# Altium footprint library Lib.PcbLib: 177 footprints (part 9 of 12)
Each footprint in its own frame and in the unit in brackets; x right, y up, seen from the top. Pads: shape width x height; smd on the part's side, far side on the other; paste and mask are expansions set on the pad; w line width, h text height; cw(c..) or ccw(c..) is an arc to the next point about the centre after c.
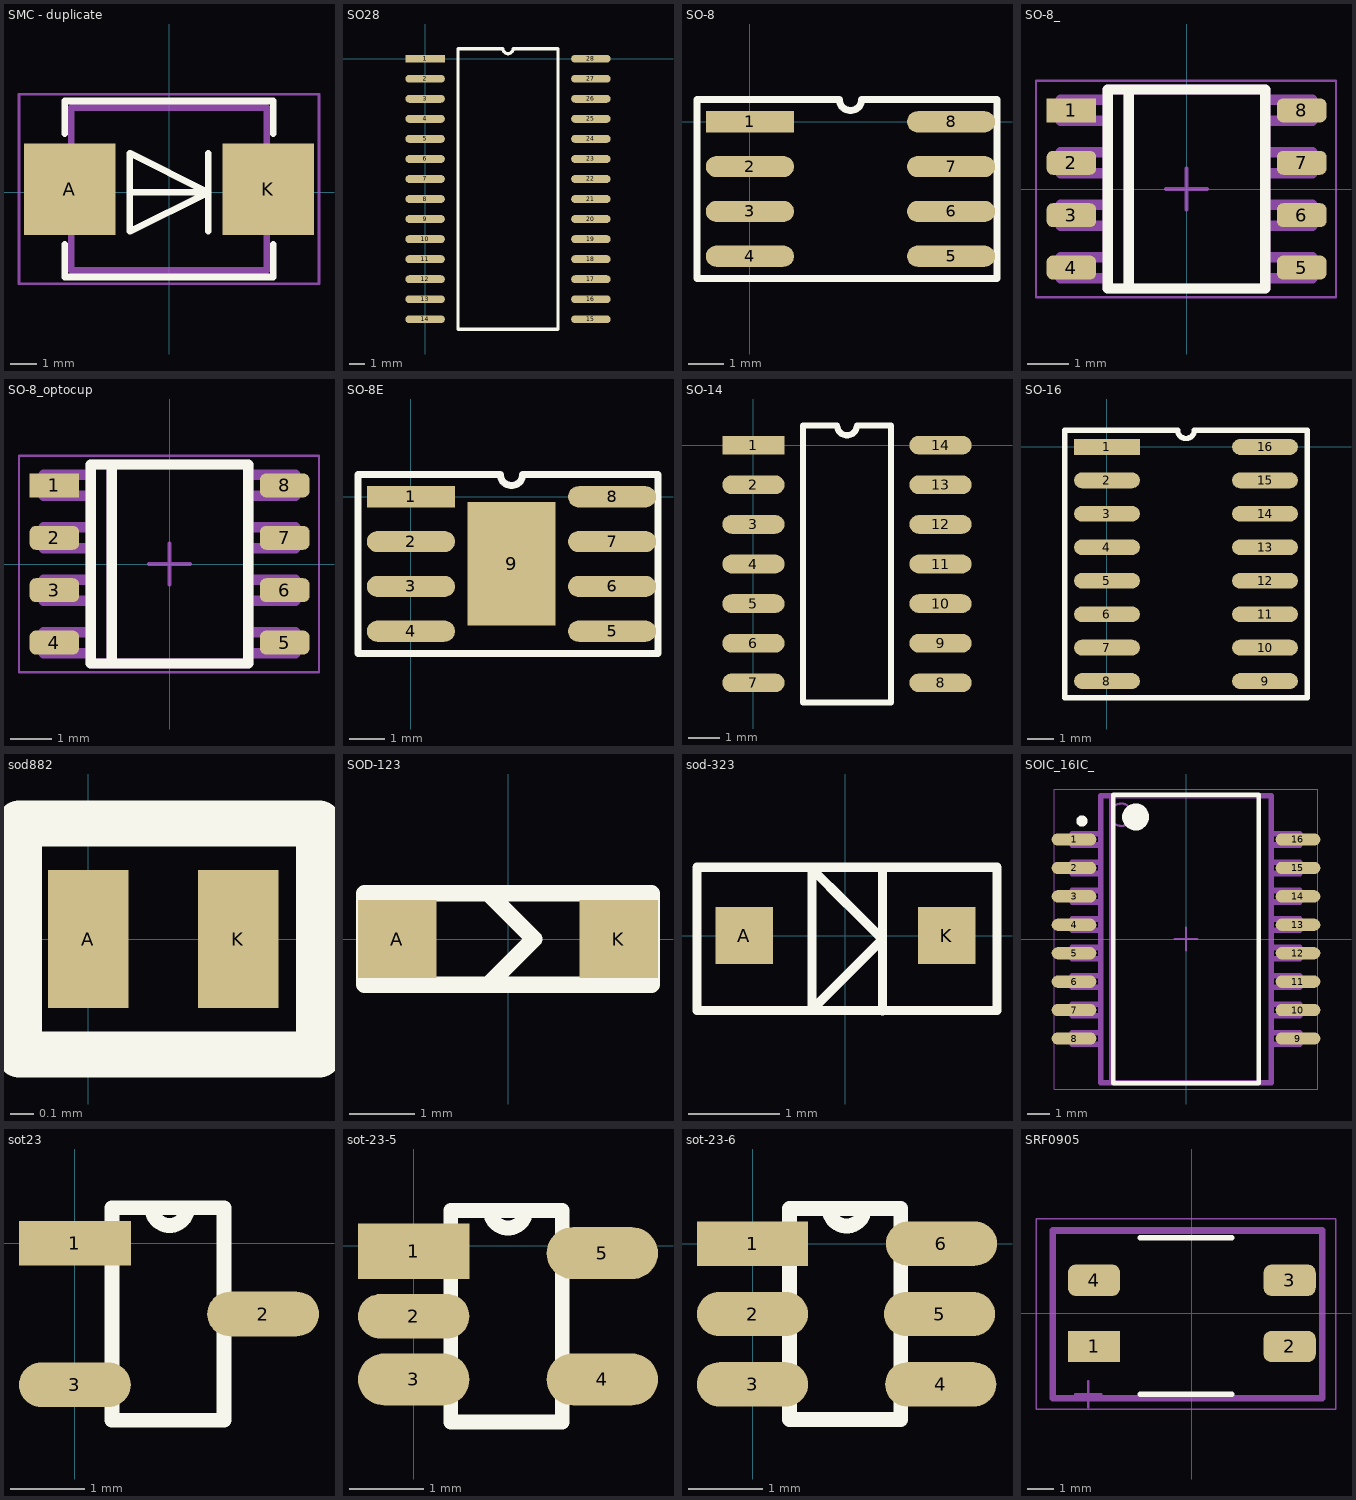
[diagram p8: the footprints below, top view; thin cyan lines are the x and y axes]

## SMC - duplicate [mm]
pads (2):
  rect 3.5x3.5 smd: A(-3.809,0.11) K(3.809,0.11)
Top Overlay:
  lines w0.254: -4,-2 -4,-3.25 4,-3.25 4,-2 ; -4,2.25 -4,3.5 4,3.5 4,2.25 ; -1.5,0 1.5,0 ; 1.5,-1.5 1.5,1.5 ; 1.5,0 -1.5,1.5 -1.5,-1.5 1.5,0
Mechanical 11:
  lines w0.254: -3.75,-3 3.75,-3 3.75,3.25 -3.75,3.25 -3.75,-3
Mechanical 13:
  lines w0.1: -3.809,-3 3.809,-3 3.809,3.22 -3.809,3.22 -3.809,-3
Mechanical 15:
  lines w0.1: -5.75,-3.5 5.75,-3.5 5.75,3.75 -5.75,3.75 -5.75,-3.5
3D body "SW3DPS-SMC-DEFAULT.STEP": height 2.8, standoff 0, extent -3.809,-3 3.809,3.22

## SO28 [mm]
height 2
pads (28):
  rect 2.5x0.5 smd: 1(0,0)
  oval 2.5x0.5 smd: 2(0,-1.27) 3(0,-2.54) 4(0,-3.81) 5(0,-5.08) 6(0,-6.35) 7(0,-7.62) 8(0,-8.89) 9(0,-10.16) 10(0,-11.43) 11(0,-12.7) 12(0,-13.97) 13(0,-15.24) 14(0,-16.51) 15(10.5,-16.51) 16(10.5,-15.24) 17(10.5,-13.97) 18(10.5,-12.7) 19(10.5,-11.43) 20(10.5,-10.16) 21(10.5,-8.89) 22(10.5,-7.62) 23(10.5,-6.35) 24(10.5,-5.08) 25(10.5,-3.81) 26(10.5,-2.54) 27(10.5,-1.27) 28(10.5,0)
Top Overlay:
  lines w0.2: 2.085,-17.145 8.415,-17.145 8.415,0.635 5.567,0.635 cw(c5.25,0.635) 4.932,0.635 2.085,0.635 2.085,-17.145

## SO-8 [mm]
pads (8):
  rect 2.5x0.6 smd: 1(0,0)
  oval 2.5x0.6 smd: 2(0,-1.27) 3(0,-2.54) 4(0,-3.81) 5(5.7,-3.81) 6(5.7,-2.54) 7(5.7,-1.27) 8(5.7,0)
Top Overlay:
  lines w0.2: -1.5,-4.445 7,-4.445 7,0.635 3.167,0.635 cw(c2.85,0.635) 2.532,0.635 -1.5,0.635 -1.5,-4.445
3D body "SW3DPS-SO-8-DEFAULT.STEP": height 1.45, standoff 0, extent 0.011,-4.377 5.789,0.525

## SO-8_ [mm]
height 1.75
pads (8):
  rect 1.2x0.58 smd: 1(-2.794,1.905)
  rrect50% 1.2x0.58 smd: 2(-2.794,0.635) 3(-2.794,-0.635) 4(-2.794,-1.905) 5(2.794,-1.905) 6(2.794,-0.635) 7(2.794,0.635) 8(2.794,1.905)
Top Overlay:
  lines w0.254: -1.397,-2.413 -1.397,2.413 ; -1.905,-2.413 -1.905,2.413 1.905,2.413 1.905,-2.413 -1.905,-2.413
Mechanical 3:
  lines w0.254: -1.905,-2.159 -3.048,-2.159 -3.048,-1.651 -1.905,-1.651 ; -1.905,-0.889 -3.048,-0.889 -3.048,-0.381 -1.905,-0.381 ; -1.905,0.381 -3.048,0.381 -3.048,0.889 -1.905,0.889 ; -1.905,1.651 -3.048,1.651 -3.048,2.159 -1.905,2.159 ; -1.397,-2.413 -1.397,2.413 ; 1.905,-2.159 3.048,-2.159 3.048,-1.651 1.905,-1.651 ; 1.905,-0.889 3.048,-0.889 3.048,-0.381 1.905,-0.381 ; 1.905,0.381 3.048,0.381 3.048,0.889 1.905,0.889 ; 1.905,1.651 3.048,1.651 3.048,2.159 1.905,2.159 ; -1.905,-2.413 1.905,-2.413 1.905,2.413 -1.905,2.413 -1.905,-2.413
Mechanical 13:
  lines w0.1: -1.905,-2.413 -1.905,2.413 1.905,2.413 1.905,-2.413 -1.905,-2.413
Mechanical 15:
  lines w0.05: -3.65,-2.625 3.625,-2.625 3.625,2.625 -3.65,2.625 -3.65,-2.625
  lines w0.1: -0.5,0 0.5,0 ; 0,-0.5 0,0.5
3D body "SW3DPS-SO-8-DEFAULT.STEP": height 1.45, standoff 0, extent -2.889,-2.402 2.889,2.5

## SO-8_optocup [mm]
height 1.75
pads (8):
  rect 1.2x0.58 smd: 1(-2.794,1.905)
  rrect50% 1.2x0.58 smd: 2(-2.794,0.635) 3(-2.794,-0.635) 4(-2.794,-1.905) 5(2.794,-1.905) 6(2.794,-0.635) 7(2.794,0.635) 8(2.794,1.905)
Top Overlay:
  lines w0.254: -1.397,-2.413 -1.397,2.413 ; -1.905,-2.413 1.905,-2.413 1.905,2.413 -1.905,2.413 -1.905,-2.413
Mechanical 3:
  lines w0.254: -1.905,-2.159 -3.048,-2.159 -3.048,-1.651 -1.905,-1.651 ; -1.905,-0.889 -3.048,-0.889 -3.048,-0.381 -1.905,-0.381 ; -1.905,0.381 -3.048,0.381 -3.048,0.889 -1.905,0.889 ; -1.905,1.651 -3.048,1.651 -3.048,2.159 -1.905,2.159 ; -1.397,-2.413 -1.397,2.413 ; 1.905,-2.159 3.048,-2.159 3.048,-1.651 1.905,-1.651 ; 1.905,-0.889 3.048,-0.889 3.048,-0.381 1.905,-0.381 ; 1.905,0.381 3.048,0.381 3.048,0.889 1.905,0.889 ; 1.905,1.651 3.048,1.651 3.048,2.159 1.905,2.159 ; -1.905,-2.413 -1.905,2.413 1.905,2.413 1.905,-2.413 -1.905,-2.413
Mechanical 13:
  lines w0.1: -1.905,-2.413 1.905,-2.413 1.905,2.413 -1.905,2.413 -1.905,-2.413
Mechanical 15:
  lines w0.05: -3.65,-2.625 -3.65,2.625 3.625,2.625 3.625,-2.625 -3.65,-2.625
  lines w0.1: -0.5,0 0.5,0 ; 0,-0.5 0,0.5
3D body "User Library-SOIC127P610X343-8N.STEP": height 3.48, standoff 0, extent -2.99,-2.901 3.01,2.939

## SO-8E [mm]
pads (9):
  rect 2.5x0.6 smd: 1(0,0)
  oval 2.5x0.6 smd: 2(0,-1.27) 3(0,-2.54) 4(0,-3.81) 5(5.7,-3.81) 6(5.7,-2.54) 7(5.7,-1.27) 8(5.7,0)
  rect 2.5x3.5 smd: 9(2.85,-1.9)
Top Overlay:
  lines w0.2: -1.5,-4.445 7,-4.445 7,0.635 3.167,0.635 cw(c2.85,0.635) 2.532,0.635 -1.5,0.635 -1.5,-4.445
3D body "SW3DPS-SO-8-DEFAULT.STEP": height 1.45, standoff 0, extent 0.011,-4.377 5.789,0.525

## SO-14 [mm]
pads (14):
  rect 2x0.6 smd: 1(0,0)
  oval 2x0.6 smd: 2(0,-1.27) 3(0,-2.54) 4(0,-3.81) 5(0,-5.08) 6(0,-6.35) 7(0,-7.62) 8(6,-7.62) 9(6,-6.35) 10(6,-5.08) 11(6,-3.81) 12(6,-2.54) 13(6,-1.27) 14(6,0)
Top Overlay:
  lines w0.2: 1.585,-8.255 4.415,-8.255 4.415,0.635 3.317,0.635 cw(c3,0.635) 2.682,0.635 1.585,0.635 1.585,-8.255

## SO-16 [mm]
pads (16):
  rect 2.5x0.6 smd: 1(0,0)
  oval 2.5x0.6 smd: 2(0,-1.27) 3(0,-2.54) 4(0,-3.81) 5(0,-5.08) 6(0,-6.35) 7(0,-7.62) 8(0,-8.89) 9(6,-8.89) 10(6,-7.62) 11(6,-6.35) 12(6,-5.08) 13(6,-3.81) 14(6,-2.54) 15(6,-1.27) 16(6,0)
Top Overlay:
  lines w0.2: -1.6,-9.525 -1.6,0.635 2.682,0.635 ccw(c3,0.635) 3.317,0.635 7.6,0.635 7.6,-9.525 -1.6,-9.525
3D body: height 2, standoff 0.2, extent 0,-9.5 6,0.5

## sod882 [mm]
pads (2):
  rect 0.35x0.6 smd: A(0,0) K(0.65,0)
Top Overlay:
  lines w0.2: -0.3,-0.5 1,-0.5 1,0.5 -0.3,0.5 -0.3,-0.5
3D body "User Library-SOD882.step": height 0.49, standoff -0.01, extent -0.186,-0.311 0.836,0.311

## SOD-123 [mm]
height 2
pads (2):
  rect 1.2x1.2 smd: A(-1.7,0) K(1.7,0)
Top Overlay:
  lines w0.254: -0.3,-0.7 0.4,0 ; -0.3,0.7 0.4,0 ; -0.3,0.7 -0.3,0.7 ; 0.4,0 0.4,0 ; -2.2,-0.7 2.2,-0.7 2.2,0.7 -2.2,0.7 -2.2,-0.7
3D body "CircuitWorks-SOD123.step": height 1.3, standoff 0.03, extent -1.85,-0.8 1.85,0.8

## sod-323 [mm]
pads (2):
  rect 0.63x0.63 smd: A(-1.115,0) K(1.115,0)
Top Overlay:
  lines w0.1: -0.375,0.741 0.017,0.349 ; -0.375,-0.824 0.408,-0.041 0.017,0.35 ; -0.369,-0.814 -0.369,0.747 ; 0.408,-0.827 0.408,0.741 ; 0.017,0.349 0.017,0.35 ; -1.636,-0.824 -1.636,0.754 1.669,0.754 1.669,-0.824 -1.636,-0.824
3D body "User Library-SOD-323F.STEP": height 0.79, standoff -0.08, extent -1.35,-0.725 1.35,0.625

## SOIC_16IC_ [mm] "D?"
height 2.64
pads (16):
  oval 2x0.55 smd: 1(-5,4.445) 2(-5,3.175) 3(-5,1.905) 4(-5,0.635) 5(-5,-0.635) 6(-5,-1.905) 7(-5,-3.175) 8(-5,-4.445) 9(5,-4.445) 10(5,-3.175) 11(5,-1.905) 12(5,-0.635) 13(5,0.635) 14(5,1.905) 15(5,3.175) 16(5,4.445)
Top Overlay:
  circle w0.6: c-2.25,5.45 r0.3
  circle w0.25: c-4.65,5.27 r0.125
  lines w0.2: -3.25,-6.45 3.25,-6.45 3.25,6.45 -3.25,6.45 -3.25,-6.45
Mechanical 3:
  lines w0.254: -3.81,-4.695 -5.08,-4.695 -5.08,-4.187 -3.81,-4.187 ; -3.81,-3.425 -5.08,-3.425 -5.08,-2.917 -3.81,-2.917 ; -3.81,-2.155 -5.08,-2.155 -5.08,-1.647 -3.81,-1.647 ; -3.81,-0.885 -5.08,-0.885 -5.08,-0.377 -3.81,-0.377 ; -3.81,0.385 -5.08,0.385 -5.08,0.893 -3.81,0.893 ; -3.81,1.655 -5.08,1.655 -5.08,2.163 -3.81,2.163 ; -3.81,2.925 -5.08,2.925 -5.08,3.433 -3.81,3.433 ; -3.81,4.195 -5.08,4.195 -5.08,4.703 -3.81,4.703 ; -3.302,-6.4 -3.302,6.4 ; 3.81,-4.695 5.08,-4.695 5.08,-4.187 3.81,-4.187 ; 3.81,-3.425 5.08,-3.425 5.08,-2.917 3.81,-2.917 ; 3.81,-2.155 5.08,-2.155 5.08,-1.647 3.81,-1.647 ; 3.81,-0.885 5.08,-0.885 5.08,-0.377 3.81,-0.377 ; 3.81,0.385 5.08,0.385 5.08,0.893 3.81,0.893 ; 3.81,1.655 5.08,1.655 5.08,2.163 3.81,2.163 ; 3.81,2.925 5.08,2.925 5.08,3.433 3.81,3.433 ; 3.81,4.195 5.08,4.195 5.08,4.703 3.81,4.703 ; -3.81,-6.425 -3.81,6.4 -0.716,6.4 3.094,6.4 3.81,6.4 3.81,-6.425 -3.81,-6.425
Mechanical 11:
  lines w0.05: -5.875,-6.7 5.875,-6.7 5.875,6.7 -5.875,6.7 -5.875,-6.7
  lines w0.1: -0.5,0 0.5,0 ; 0,-0.5 0,0.5
Mechanical 13:
  circle w0.1: c-2.9,5.55 r0.5
  lines w0.1: -3.8,-6.45 3.8,-6.45 3.8,6.45 -3.8,6.45 -3.8,-6.45
3D body "User Library-SOIC16_Wide_JEDEC_MS-013AA.step": height 2.72, standoff 0.07, extent -5.29,-5.25 5.34,5.25
3D body: height 2.64, standoff 0.23, extent -3.8,-6.45 3.8,6.45

## sot23 [mm]
pads (3):
  rect 1.5x0.6 smd: 1(0,0)
  oval 1.5x0.6 smd: 2(2.525,-0.95) 3(0,-1.9)
Top Overlay:
  lines w0.2: 0.5,-2.375 0.5,0.475 1.508,0.475 cw(c1.27,0.475) 1.032,0.475 2,0.475 2,-2.375 0.5,-2.375
3D body "CircuitWorks-SOT-23.step": height 1.1, standoff 0, extent 0.025,-2.45 2.525,0.55

## sot-23-5 [mm]
pads (5):
  rect 1.5x0.75 smd: 1(0,-0.075)
  oval 1.5x0.6 smd: 2(0,-0.95)
  oval 1.5x0.7 smd: 3(0,-1.8) 4(2.54,-1.8) 5(2.54,-0.1)
Top Overlay:
  lines w0.2: 0.5,-2.375 0.5,0.475 1.508,0.475 cw(c1.27,0.475) 1.032,0.475 2,0.475 2,-2.375 0.5,-2.375
3D body "SW3DPS-SOT-23-5-DEFAULT.STEP": height 1.1, standoff 0, extent 0.05,-2.45 2.55,0.55
3D body "User Library-SC70-5-1.STEP": height 0.95, standoff 0, extent 0.25,-1.95 2.35,0.05

## sot-23-6 [mm]
pads (6):
  rect 1.5x0.6 smd: 1(0,0)
  oval 1.5x0.6 smd: 2(0,-0.95) 3(0,-1.9) 4(2.54,-1.9) 5(2.525,-0.95) 6(2.55,0)
Top Overlay:
  lines w0.2: 0.5,-2.375 2,-2.375 2,0.475 1.032,0.475 ccw(c1.27,0.475) 1.508,0.475 0.5,0.475 0.5,-2.375
3D body "User Library-SOT23-6-2.STEP": height 1.45, standoff 0, extent -0.075,-2.4 2.725,0.5

## SRF0905 [mm] "Inductor, 4-Leads"
height 6.5
pads (4):
  rect 2x1.2 smd: 1(-3.75,-1.27)
  rrect50% 2x1.2 smd: 2(3.75,-1.27) 3(3.75,1.27) 4(-3.75,1.27)
Top Overlay:
  lines w0.2: -1.975,-3.1 1.525,-3.1 ; -1.975,2.9 1.525,2.9
Mechanical 3:
  lines w0.254: -5.335,-3.25 5.005,-3.25 5.005,3.175 -5.335,3.175 -5.335,-3.25
Mechanical 13:
  lines w0.1: -5.335,-3.225 5.005,-3.225 5.005,3.175 -5.335,3.175 -5.335,-3.225
Mechanical 15:
  lines w0.05: -5.975,-3.675 5.525,-3.675 5.525,3.625 -5.975,3.625 -5.975,-3.675
  lines w0.1: -4.475,-3.1 -3.475,-3.1 ; -3.975,-3.6 -3.975,-2.6
3D body "User Library-Bourns - SRF0905.step": height 5, standoff 0, extent -4.6,-3 4.6,3